# Altium footprint library MyLib.PcbLib: 575 footprints (part 1 of 36)
Each footprint in its own frame and in the unit in brackets; x right, y up, seen from the top. Pads: shape width x height; smd on the part's side, far side on the other; paste and mask are expansions set on the pad; w line width, h text height; cw(c..) or ccw(c..) is an arc to the next point about the centre after c.
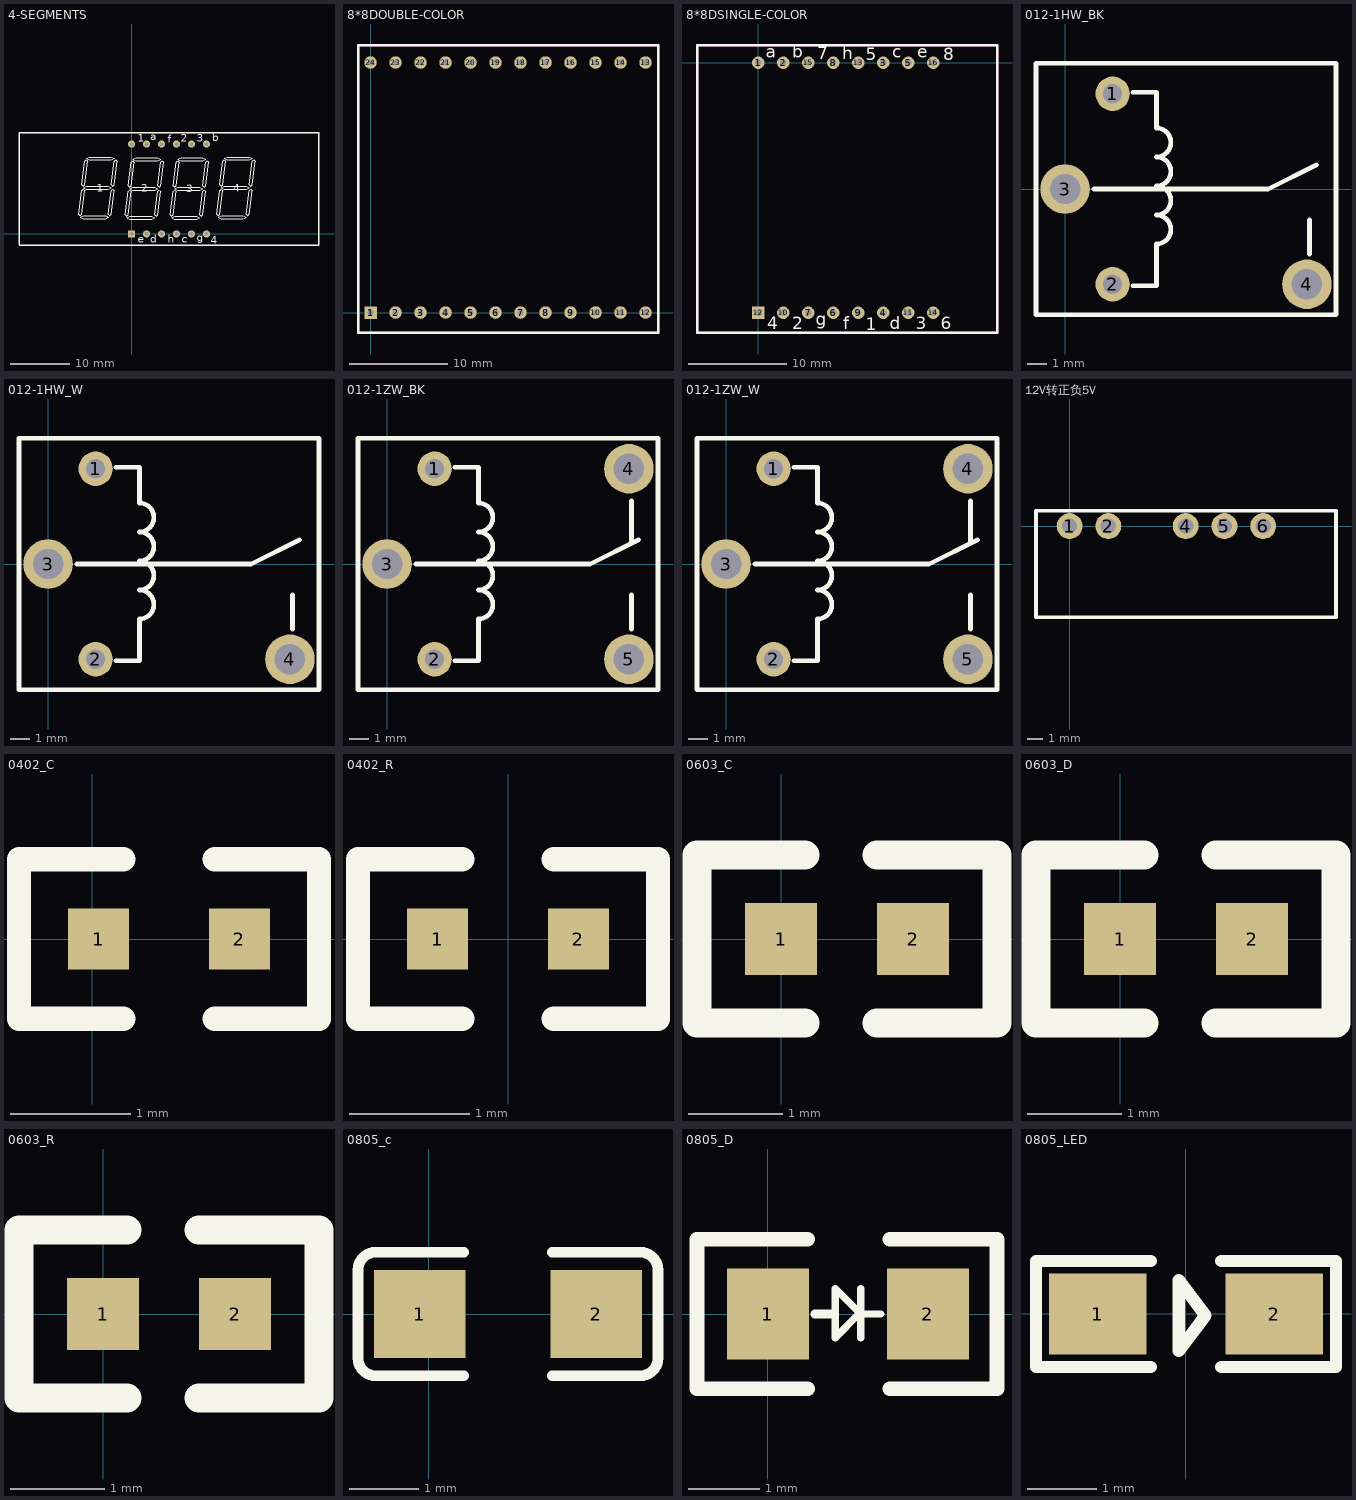
[diagram p0: the footprints below, top view; thin cyan lines are the x and y axes]

## 4-SEGMENTS [mm]
pads (12):
  rect 1.2x1.2 hole 0.6: 1(0,0.005)
  round 1.2 hole 0.6: 2(2.54,0.005) 3(5.08,0.005) 4(7.62,0.005) 5(10.16,0.005) 6(12.7,0.005) 7(12.7,15.245) 8(10.16,15.245) 9(7.62,15.245) 10(5.08,15.245) 11(2.54,15.245) 12(0,15.245)
Top Overlay:
  drawing of 175 lines, arcs and shapes, not listed
  text "e" at 1.016,-1.519 h1.27
  text "d" at 3.175,-1.519 h1.27
  text "h" at 6.096,-1.519 h1.27
  text "c" at 8.509,-1.519 h1.27
  text "g" at 11.049,-1.265 h1.27
  text "4" at 13.462,-1.646 h1.27
  text "1" at 1.016,15.626 h1.27
  text "a" at 3.175,15.88 h1.27
  text "f" at 6.096,15.499 h1.27
  text "2" at 8.382,15.626 h1.27
  text "3" at 11.049,15.626 h1.27
  text "b" at 13.716,15.753 h1.27
  text "1" at -5.868,7.143 h1.27
  text "2" at 1.625,7.117 h1.27
  text "3" at 9.296,7.067 h1.27
  text "4" at 17.221,7.143 h1.27
3D body: height 4.9, standoff 0.5, extent -19.197,-2.027 31.897,17.277
3D body: height 5, standoff 0.5, extent 15.709,12.551 20.463,13.049
3D body: height 5, standoff 0.5, extent 7.335,7.451 12.089,7.949
3D body: height 5, standoff 0.5, extent -0.786,2.479 3.969,2.977
3D body: height 5, standoff 0.5, extent -19.071,-1.9 31.75,17.101
3D body: height 5, standoff 0.5, extent 15.209,7.578 19.963,8.076
3D body: height 5, standoff 0.5, extent 7.084,7.948 8.086,12.425
3D body: height 5, standoff 0.5, extent 7.835,12.424 12.589,12.922
3D body: height 5, standoff 0.5, extent 12.088,7.948 13.09,12.425
3D body: height 5, standoff 0.5, extent -19.051,-1.85 31.77,17.151
3D body: height 5, standoff 0.5, extent 11.588,2.976 12.589,7.452
3D body: height 5, standoff 0.5, extent -0.536,7.948 0.466,12.425
3D body: height 5, standoff 0.5, extent -3.906,3.103 -2.905,7.579
3D body: height 5, standoff 0.5, extent 6.834,2.479 11.589,2.977
3D body: height 5, standoff 0.5, extent -1.036,2.976 -0.034,7.452
3D body: height 5, standoff 0.5, extent -0.285,7.451 4.469,7.949
3D body: height 5, standoff 0.5, extent -8.66,2.606 -3.905,3.104
3D body: height 5, standoff 0.5, extent -8.159,7.578 -3.405,8.076
3D body: height 5, standoff 0.5, extent 3.968,2.976 4.969,7.452
3D body: height 5, standoff 0.5, extent 4.468,7.948 5.47,12.425
3D body: height 5, standoff 0.5, extent -3.406,8.075 -2.404,12.552
3D body: height 5, standoff 0.5, extent -8.41,8.075 -7.408,12.552
3D body: height 5, standoff 0.5, extent -7.659,12.551 -2.905,13.049
3D body: height 5, standoff 0.5, extent 0.215,12.424 4.969,12.922
3D body: height 5, standoff 0.5, extent 19.462,3.103 20.463,7.579
3D body: height 5, standoff 0.5, extent -8.91,3.103 -7.908,7.579
3D body: height 5, standoff 0.5, extent 14.458,3.103 15.46,7.579
3D body: height 5, standoff 0.5, extent 14.708,2.606 19.463,3.104
3D body: height 5, standoff 0.5, extent 19.962,8.075 20.964,12.552
3D body: height 5, standoff 0.5, extent 6.584,2.976 7.586,7.452
3D body: height 5, standoff 0.5, extent 14.958,8.075 15.96,12.552

## 8*8DOUBLE-COLOR [mm]
pads (24):
  rect 1.27x1.27 hole 0.635: 1(0,0)
  round 1.27 hole 0.635: 2(2.54,0) 3(5.08,0) 4(7.62,0) 5(10.16,0) 6(12.7,0) 7(15.24,0) 8(17.78,0) 9(20.32,0) 10(22.86,0) 11(25.4,0) 12(27.94,0) 13(27.94,25.4) 14(25.4,25.4) 15(22.86,25.4) 16(20.32,25.4) 17(17.78,25.4) 18(15.24,25.4) 19(12.7,25.4) 20(10.16,25.4) 21(7.62,25.4) 22(5.08,25.4) 23(2.54,25.4) 24(0,25.4)
Top Overlay:
  lines w0.254: -1.27,-2.057 -1.27,27.153 29.21,27.153 29.21,-2.057 -1.27,-2.057
Mechanical 1:
  lines w0.254: -1.27,-2.057 29.21,-2.057 29.21,27.153 -1.27,27.153 -1.27,-2.057
3D body "8DotArray.STEP": height 1.5, standoff -5.8, extent -1.27,-2.159 29.21,27.051

## 8*8DSINGLE-COLOR [mm]
pads (16):
  round 1.27 hole 0.635: 1(0,0) 2(2.54,0) 3(12.7,0) 4(12.7,-25.4) 5(15.24,0) 6(7.62,-25.4) 7(5.08,-25.4) 8(7.62,0) 9(10.16,-25.4) 10(2.54,-25.4) 11(15.24,-25.4) 13(10.16,0) 14(17.78,-25.4) 15(5.08,0) 16(17.78,0)
  rect 1.27x1.27 hole 0.635: 12(0,-25.4)
Top Overlay:
  lines w0.254: -6.223,-27.432 -6.223,1.778 24.257,1.778 24.257,-27.432 -6.223,-27.432
  text "1" at 10.922,-27.178 h1.27
  text "2" at 3.429,-27.051 h1.27
  text "3" at 16.002,-27.051 h1.27
  text "4" at 0.889,-27.051 h1.27
  text "5" at 10.922,0.254 h1.27
  text "6" at 18.542,-27.051 h1.27
  text "7" at 5.969,0.381 h1.27
  text "8" at 18.796,0.254 h1.27
  text "h" at 8.509,0.381 h1.27
  text "g" at 5.842,-26.67 h1.27
  text "f" at 8.636,-27.051 h1.27
  text "e" at 16.129,0.508 h1.27
  text "d" at 13.335,-27.051 h1.27
  text "c" at 13.589,0.508 h1.27
  text "b" at 3.429,0.508 h1.27
  text "a" at 0.762,0.508 h1.27
Mechanical 1:
  lines w0.254: -6.223,-27.432 24.257,-27.432 24.257,1.778 -6.223,1.778 -6.223,-27.432
3D body: height 5.8, standoff -1.5, extent -6.35,-27.305 24.13,1.905

## 012-1HW_BK [mm] "单刀单投/常开"
pads (4):
  round 1.8 hole 1: 1(2.5,5) 2(2.5,-5)
  round 2.6 hole 1.6: 3(0,0) 4(12.7,-5)
Top Overlay:
  lines w0.254: 1.524,0 10.668,0 13.208,1.27 ; 3.556,-5.08 4.794,-5.08 4.794,-2.89 ccw(c4.794,-2.128) 4.794,-1.366 ccw(c4.794,-0.604) 4.794,0.158 ccw(c4.794,0.92) 4.794,1.682 ccw(c4.794,2.444) 4.794,3.206 4.794,5.08 3.556,5.08 ; 12.827,-3.429 12.838,-1.62 ; -1.524,-6.604 -1.524,6.604 14.224,6.604 14.224,-6.604 -1.524,-6.604
3D body "012-1HW_BK-.STEP": height 12.9, standoff -3.6, extent -1.524,-6.1 13.976,6.1

## 012-1HW_W [mm] "单刀单投/常开"
pads (4):
  round 1.8 hole 1: 1(2.5,5) 2(2.5,-5)
  round 2.6 hole 1.6: 3(0,0) 4(12.7,-5)
Top Overlay:
  lines w0.254: 1.524,0 10.668,0 13.208,1.27 ; 3.556,-5.08 4.794,-5.08 4.794,-2.89 ccw(c4.794,-2.128) 4.794,-1.366 ccw(c4.794,-0.604) 4.794,0.158 ccw(c4.794,0.92) 4.794,1.682 ccw(c4.794,2.444) 4.794,3.206 4.794,5.08 3.556,5.08 ; 12.827,-3.429 12.838,-1.62 ; -1.524,-6.604 14.224,-6.604 14.224,6.604 -1.524,6.604 -1.524,-6.604
3D body "012-1HW_W-.STEP": height 12.9, standoff -3.6, extent -1.524,-6.1 13.976,6.1

## 012-1ZW_BK [mm] "单刀双投"
pads (5):
  round 1.8 hole 1: 1(2.5,5) 2(2.5,-5)
  round 2.6 hole 1.6: 3(0,0) 4(12.7,5) 5(12.7,-5)
Top Overlay:
  lines w0.254: 1.524,0 10.668,0 13.208,1.27 ; 3.556,-5.08 4.794,-5.08 4.794,-2.89 ccw(c4.794,-2.128) 4.794,-1.366 ccw(c4.794,-0.604) 4.794,0.158 ccw(c4.794,0.92) 4.794,1.682 ccw(c4.794,2.444) 4.794,3.206 4.794,5.08 3.556,5.08 ; 12.827,-3.429 12.838,-1.62 ; 12.838,1.174 12.838,3.302 ; -1.524,-6.604 14.224,-6.604 14.224,6.604 -1.524,6.604 -1.524,-6.604
3D body "012-1ZW_BK-.STEP": height 12.9, standoff -3.6, extent -1.524,-6.227 13.976,5.973

## 012-1ZW_W [mm] "单刀双投"
pads (5):
  round 1.8 hole 1: 1(2.5,5) 2(2.5,-5)
  round 2.6 hole 1.6: 3(0,0) 4(12.7,5) 5(12.7,-5)
Top Overlay:
  lines w0.254: 1.524,0 10.668,0 13.208,1.27 ; 3.556,-5.08 4.794,-5.08 4.794,-2.89 ccw(c4.794,-2.128) 4.794,-1.366 ccw(c4.794,-0.604) 4.794,0.158 ccw(c4.794,0.92) 4.794,1.682 ccw(c4.794,2.444) 4.794,3.206 4.794,5.08 3.556,5.08 ; 12.827,-3.429 12.838,-1.62 ; 12.838,1.174 12.838,3.302 ; -1.524,-6.604 14.224,-6.604 14.224,6.604 -1.524,6.604 -1.524,-6.604
3D body "012-1ZW_W-.STEP": height 12.9, standoff -3.6, extent -1.524,-6.104 13.976,6.096

## 12V转正负5V [mm]
pads (5):
  round 1.7 hole 1: 1(0,0) 2(2.54,0) 4(7.62,0) 5(10.16,0) 6(12.7,0)
Top Overlay:
  lines w0.254: -2.205,-5.98 -2.205,1.005 17.48,1.005 17.48,-5.98 -2.205,-5.98

## 0402_C [mil]
pads (2):
  rect 20x20 smd: 1(2,0) 2(48,0)
Top Overlay:
  lines w8: 10,-26 -24,-26 -24,26 10,26 ; 40,-26 74,-26 74,26 40,26
3D body: height 13.78, standoff 0, extent 5.31,-9.84 44.68,9.84

## 0402_R [mil]
pads (2):
  rect 20x20 smd: 1(-23,0) 2(23,0)
Top Overlay:
  lines w8: -15,-26 -49,-26 -49,26 -15,26 ; 15,-26 49,-26 49,26 15,26
3D body: height 13.78, standoff 0, extent -19.69,-9.84 19.69,9.84

## 0603_C [mil]
pads (2):
  rect 30x30 smd: 1(0,0) 2(55,0)
Top Overlay:
  lines w12: 10,-35 -35,-35 -35,35 10,35 ; 40,-35 90,-35 90,35 40,35
3D body: height 17.72, standoff 0, extent -1.5,-15.75 61.5,15.74

## 0603_D [mil]
pads (2):
  rect 30x30 smd: 1(0,0) 2(55,0)
Top Overlay:
  lines w12: 10,-35 -35,-35 -35,35 10,35 ; 40,-35 90,-35 90,35 40,35
3D body "DIOMELF1911N.STEP": height 41.65, standoff -1.65, extent -12.4,-21.65 62.4,21.65

## 0603_R [mil]
pads (2):
  rect 30x30 smd: 1(0,0) 2(55,0)
Top Overlay:
  lines w12: 10,-35 -35,-35 -35,35 10,35 ; 40,-35 90,-35 90,35 40,35
3D body: height 17.72, standoff 0, extent -6.5,-15.75 56.5,15.75

## 0805_c [mil]
pads (2):
  rect 52x50 smd: 1(-5,0) 2(95,0)
Top Overlay:
  lines w6: 20,-35 -30,-35 cw(c-30,-25) -40,-25 -40,25 cw(c-30,25) -30,35 20,35 ; 70,-35 120,-35 ccw(c120,-25) 130,-25 130,25 ccw(c120,25) 120,35 70,35
3D body "Capacitor 0805 SMD.step": height 36.61, standoff -0.39, extent -13.11,-27.56 105,27.56

## 0805_D [mil]
pads (2):
  rect 45x50 smd: 1(0,0) 2(88,0)
Top Overlay:
  lines w4: 51,-13 51,14 ; 62,0 51,0 ; 51,0 50,0 37,-13 37,14 51,0
  lines w5: 26,0 36,0
  lines w8: 22,-41 -39,-41 -39,41 22,41 ; 67,-41 126,-41 126,41 67,41
3D body "DIOMELF3414N.STEP": height 52.56, standoff -2.56, extent -26.93,-27.56 106.93,27.56

## 0805_LED [mil]
pads (2):
  rect 55.12x46 smd: 1(-50,0) 2(50,0)
Top Overlay:
  lines w7: -20,-30 -85,-30 -85,30 -20,30 ; 20,-30 85,-30 85,30 20,30 ; -4.02,-20.87 -4.02,19.13 10.98,-0.87 -4.02,-20.87
3D body "LED0805(B).STEP": height 43.31, standoff 0, extent -39.75,-24.6 39.77,24.61